# Altium footprint library MODULE_BBB.PcbLib: 1 footprints
Each footprint in its own frame and in the unit in brackets; x right, y up, seen from the top. Pads: shape width x height; smd on the part's side, far side on the other; paste and mask are expansions set on the pad; w line width, h text height; cw(c..) or ccw(c..) is an arc to the next point about the centre after c.
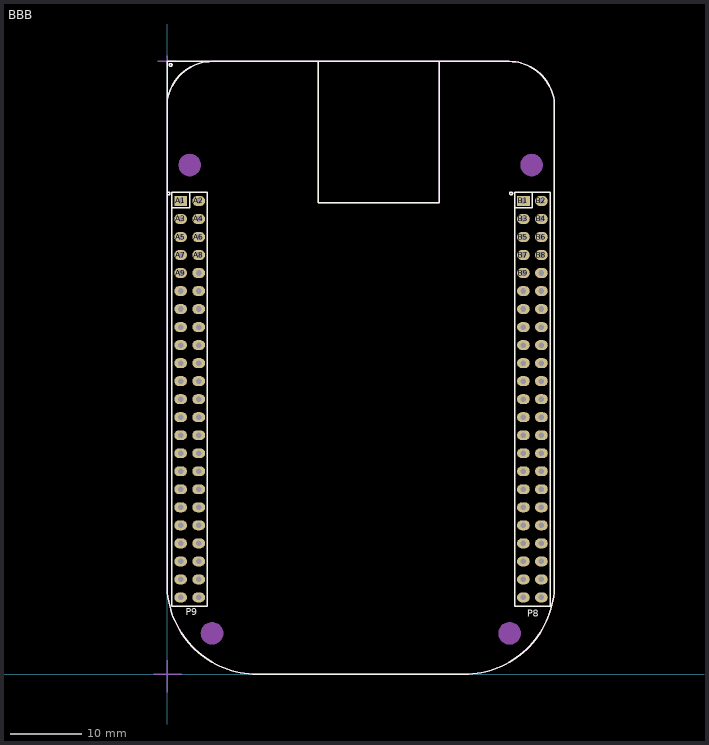
[diagram p0: the footprint, top view; thin cyan lines are the x and y axes]

## BBB [mm] "BeagleBoneBlack Board"
pads (188):
  round 1 on Mech1: 1(1.93,66.74) 1(50.23,66.74) 2(4.47,66.74) 2(52.77,66.74) 3(1.93,64.2) 3(50.23,64.2) 4(4.47,64.2) 4(52.77,64.2) 5(1.93,61.66) 5(50.23,61.66) 6(4.47,61.66) 6(52.77,61.66) 7(1.93,59.12) 7(50.23,59.12) 8(4.47,59.12) 8(52.77,59.12) 9(1.93,56.58) 9(50.23,56.58) 10(4.47,56.58) 10(52.77,56.58) 11(1.93,54.04) 11(50.23,54.04) 12(4.47,54.04) 12(52.77,54.04) 13(1.93,51.5) 13(50.23,51.5) 14(4.47,51.5) 14(52.77,51.5) 15(1.93,48.96) 15(50.23,48.96) 16(4.47,48.96) 16(52.77,48.96) 17(1.93,46.42) 17(50.23,46.42) 18(4.47,46.42) 18(52.77,46.42) 19(1.93,43.88) 19(50.23,43.88) 20(4.47,43.88) 20(52.77,43.88) 21(1.93,41.34) 21(50.23,41.34) 22(4.47,41.34) 22(52.77,41.34) 23(1.93,38.8) 23(50.23,38.8) 24(4.47,38.8) 24(52.77,38.8) 25(1.93,36.26) 25(50.23,36.26) 26(4.47,36.26) 26(52.77,36.26) 27(1.93,33.72) 27(50.23,33.72) 28(4.47,33.72) 28(52.77,33.72) 29(1.93,31.18) 29(50.23,31.18) 30(4.47,31.18) 30(52.77,31.18) 31(1.93,28.64) 31(50.23,28.64) 32(4.47,28.64) 32(52.77,28.64) 33(1.93,26.1) 33(50.23,26.1) 34(4.47,26.1) 34(52.77,26.1) 35(1.93,23.56) 35(50.23,23.56) 36(4.47,23.56) 36(52.77,23.56) 37(1.93,21.02) 37(50.23,21.02) 38(4.47,21.02) 38(52.77,21.02) 39(1.93,18.48) 39(50.23,18.48) 40(4.47,18.48) 40(52.77,18.48) 41(1.93,15.94) 41(50.23,15.94) 42(4.47,15.94) 42(52.77,15.94) 43(1.93,13.4) 43(50.23,13.4) 44(4.47,13.4) 44(52.77,13.4) 45(1.93,10.86) 45(50.23,10.86) 46(4.47,10.86) 46(52.77,10.86)
  rect 1.8x1.4 / inner rect 1.2x1.2 / far side rect 1.4x1.4 hole 0.8: A1(1.93,66.74) B1(50.23,66.74)
  oval 1.8x1.4 / inner round 1.2 / far side round 1.4 hole 0.8: A2(4.47,66.74) A3(1.93,64.2) A4(4.47,64.2) A5(1.93,61.66) A6(4.47,61.66) A7(1.93,59.12) A8(4.47,59.12) A9(1.93,56.58) A10(4.47,56.58) A11(1.93,54.04) A12(4.47,54.04) A13(1.93,51.5) A14(4.47,51.5) A15(1.93,48.96) A16(4.47,48.96) A17(1.93,46.42) A18(4.47,46.42) A19(1.93,43.88) A20(4.47,43.88) A21(1.93,41.34) A22(4.47,41.34) A23(1.93,38.8) A24(4.47,38.8) A25(1.93,36.26) A26(4.47,36.26) A27(1.93,33.72) A28(4.47,33.72) A29(1.93,31.18) A30(4.47,31.18) A31(1.93,28.64) A32(4.47,28.64) A33(1.93,26.1) A34(4.47,26.1) A35(1.93,23.56) A36(4.47,23.56) A37(1.93,21.02) A38(4.47,21.02) A39(1.93,18.48) A40(4.47,18.48) A41(1.93,15.94) A42(4.47,15.94) A43(1.93,13.4) A44(4.47,13.4) A45(1.93,10.86) A46(4.47,10.86) B2(52.77,66.74) B3(50.23,64.2) B4(52.77,64.2) B5(50.23,61.66) B6(52.77,61.66) B7(50.23,59.12) B8(52.77,59.12) B9(50.23,56.58) B10(52.77,56.58) B11(50.23,54.04) B12(52.77,54.04) B13(50.23,51.5) B14(52.77,51.5) B15(50.23,48.96) B16(52.77,48.96) B17(50.23,46.42) B18(52.77,46.42) B19(50.23,43.88) B20(52.77,43.88) B21(50.23,41.34) B22(52.77,41.34) B23(50.23,38.8) B24(52.77,38.8) B25(50.23,36.26) B26(52.77,36.26) B27(50.23,33.72) B28(52.77,33.72) B29(50.23,31.18) B30(52.77,31.18) B31(50.23,28.64) B32(52.77,28.64) B33(50.23,26.1) B34(52.77,26.1) B35(50.23,23.56) B36(52.77,23.56) B37(50.23,21.02) B38(52.77,21.02) B39(50.23,18.48) B40(52.77,18.48) B41(50.23,15.94) B42(52.77,15.94) B43(50.23,13.4) B44(52.77,13.4) B45(50.23,10.86) B46(52.77,10.86)
  round 3.2 on Mech1: ""(3.2,71.8) ""(6.35,5.8) ""(48.3,5.8) ""(51.4,71.8)
Top Overlay:
  circle w0.2: c0.505,85.915 r0.2
  circle w0.2: c0.2,67.8 r0.2
  circle w0.2: c48.5,67.8 r0.2
  lines w0.2: 0.7,65.8 3.2,65.8 3.2,68 ; 21.3,86.3 21.3,66.5 38.4,66.5 38.4,86.3 ; 49,65.8 51.5,65.8 51.5,68 ; 0,80.05 cw(c6.35,80.05) 6.35,86.4 ; 0,80.05 0,86.4 6.35,86.4 ; 0,80.05 0,12.74 ccw(c12.7,12.74) 12.7,0.04 41.91,0.04 ccw(c41.91,12.74) 54.61,12.74 54.61,80.05 ccw(c48.26,80.05) 48.26,86.4 6.35,86.4 ; 0.7,9.6 0.7,68 5.7,68 5.7,9.6 0.7,9.6 ; 49,9.6 49,68 54,68 54,9.6 49,9.6
  text "P9" at 2.605,8.315 h1
  text "P8" at 50.805,8.115 h1
Bottom Overlay:
  circle w0.2: c0.2,67.85 r0.2
  circle w0.2: c48.5,67.85 r0.2
  lines w0.2: 0.7,65.8 3.1,65.8 3.1,68 ; 49,65.8 51.4,65.8 51.4,68 ; 0.7,9.6 5.7,9.6 5.7,68 0.7,68 0.7,9.6 ; 49,9.6 54,9.6 54,68 49,68 49,9.6
  text "P9" at 4.005,8.315 h1
  text "P8" at 52.205,8.115 h1
Mechanical 1:
  lines w0.2: -1.9,0 2.1,0 ; -1.3,86.4 1.3,86.4 ; 0,-2.5 0,2 ; 0,85.6 0,87.2 ; 21.3,86.3 21.3,66.5 38.4,66.5 38.4,86.3 ; 0,12.74 ccw(c12.7,12.74) 12.7,0.04 41.91,0.04 ccw(c41.91,12.74) 54.61,12.74 54.61,80.05 ccw(c48.26,80.05) 48.26,86.4 6.35,86.4 ccw(c6.35,80.05) 0,80.05 0,12.74
3D body "PIN.STEP": height 8.43, standoff -2.49, extent 51.5,9.59 54.04,12.13
3D body "PIN.STEP": height 8.43, standoff -2.49, extent 48.96,9.59 51.5,12.13
3D body "PIN.STEP": height 8.43, standoff -2.49, extent 51.5,65.47 54.04,68.01
3D body "PIN_mid.STEP": height 8.43, standoff -2.49, extent 48.96,60.39 51.5,62.93
3D body "PIN_mid.STEP": height 8.43, standoff -2.49, extent 48.96,57.85 51.5,60.39
3D body "PIN_mid.STEP": height 8.43, standoff -2.49, extent 48.96,55.31 51.5,57.85
3D body "PIN_mid.STEP": height 8.43, standoff -2.49, extent 48.96,52.77 51.5,55.31
3D body "PIN_mid.STEP": height 8.43, standoff -2.49, extent 48.96,50.23 51.5,52.77
3D body "PIN_mid.STEP": height 8.43, standoff -2.49, extent 48.96,47.69 51.5,50.23
3D body "PIN_mid.STEP": height 8.43, standoff -2.49, extent 48.96,45.15 51.5,47.69
3D body "PIN_mid.STEP": height 8.43, standoff -2.49, extent 48.96,42.61 51.5,45.15
3D body "PIN_mid.STEP": height 8.43, standoff -2.49, extent 48.96,40.07 51.5,42.61
3D body "PIN_mid.STEP": height 8.43, standoff -2.49, extent 48.96,37.53 51.5,40.07
3D body "PIN_mid.STEP": height 8.43, standoff -2.49, extent 48.96,34.99 51.5,37.53
3D body "PIN_mid.STEP": height 8.43, standoff -2.49, extent 48.96,32.45 51.5,34.99
3D body "PIN_mid.STEP": height 8.43, standoff -2.49, extent 48.96,29.91 51.5,32.45
3D body "PIN_mid.STEP": height 8.43, standoff -2.49, extent 48.96,27.37 51.5,29.91
3D body "PIN_mid.STEP": height 8.43, standoff -2.49, extent 48.96,24.83 51.5,27.37
3D body "PIN_mid.STEP": height 8.43, standoff -2.49, extent 48.96,22.29 51.5,24.83
3D body "PIN_mid.STEP": height 8.43, standoff -2.49, extent 48.96,19.75 51.5,22.29
3D body "PIN_mid.STEP": height 8.43, standoff -2.49, extent 48.96,17.21 51.5,19.75
3D body "PIN_mid.STEP": height 8.43, standoff -2.49, extent 48.96,14.67 51.5,17.21
3D body "PIN_mid.STEP": height 8.43, standoff -2.49, extent 48.96,62.93 51.5,65.47
3D body "PIN_mid.STEP": height 8.43, standoff -2.49, extent 51.5,62.93 54.04,65.47
3D body "PIN_mid.STEP": height 8.43, standoff -2.49, extent 51.5,60.39 54.04,62.93
3D body "PIN_mid.STEP": height 8.43, standoff -2.49, extent 51.5,57.85 54.04,60.39
3D body "PIN_mid.STEP": height 8.43, standoff -2.49, extent 51.5,55.31 54.04,57.85
3D body "PIN_mid.STEP": height 8.43, standoff -2.49, extent 51.5,52.77 54.04,55.31
3D body "PIN_mid.STEP": height 8.43, standoff -2.49, extent 51.5,50.23 54.04,52.77
3D body "PIN_mid.STEP": height 8.43, standoff -2.49, extent 51.5,47.69 54.04,50.23
3D body "PIN_mid.STEP": height 8.43, standoff -2.49, extent 51.5,45.15 54.04,47.69
3D body "PIN_mid.STEP": height 8.43, standoff -2.49, extent 51.5,42.61 54.04,45.15
3D body "PIN_mid.STEP": height 8.43, standoff -2.49, extent 51.5,40.07 54.04,42.61
3D body "PIN_mid.STEP": height 8.43, standoff -2.49, extent 51.5,37.53 54.04,40.07
3D body "PIN_mid.STEP": height 8.43, standoff -2.49, extent 51.5,34.99 54.04,37.53
3D body "PIN_mid.STEP": height 8.43, standoff -2.49, extent 51.5,32.45 54.04,34.99
3D body "PIN_mid.STEP": height 8.43, standoff -2.49, extent 51.5,29.91 54.04,32.45
3D body "PIN_mid.STEP": height 8.43, standoff -2.49, extent 51.5,27.37 54.04,29.91
3D body "PIN_mid.STEP": height 8.43, standoff -2.49, extent 51.5,24.83 54.04,27.37
3D body "PIN_mid.STEP": height 8.43, standoff -2.49, extent 51.5,22.29 54.04,24.83
3D body "PIN_mid.STEP": height 8.43, standoff -2.49, extent 51.5,19.75 54.04,22.29
3D body "PIN_mid.STEP": height 8.43, standoff -2.49, extent 51.5,17.21 54.04,19.75
3D body "PIN_mid.STEP": height 8.43, standoff -2.49, extent 51.5,14.67 54.04,17.21
3D body "PIN.STEP": height 8.43, standoff -2.49, extent 48.96,65.47 51.5,68.01
3D body "PIN.STEP": height 8.43, standoff -2.49, extent 48.96,12.13 51.5,14.67
3D body "PIN.STEP": height 8.43, standoff -2.49, extent 51.5,12.13 54.04,14.67
3D body "PIN.STEP": height 8.43, standoff -2.49, extent 3.2,12.13 5.74,14.67
3D body "PIN.STEP": height 8.43, standoff -2.49, extent 0.66,12.13 3.2,14.67
3D body "PIN.STEP": height 8.43, standoff -2.49, extent 0.66,65.47 3.2,68.01
3D body "PIN_mid.STEP": height 8.43, standoff -2.49, extent 3.2,14.67 5.74,17.21
3D body "PIN_mid.STEP": height 8.43, standoff -2.49, extent 3.2,17.21 5.74,19.75
3D body "PIN_mid.STEP": height 8.43, standoff -2.49, extent 3.2,19.75 5.74,22.29
3D body "PIN_mid.STEP": height 8.43, standoff -2.49, extent 3.2,22.29 5.74,24.83
3D body "PIN_mid.STEP": height 8.43, standoff -2.49, extent 3.2,24.83 5.74,27.37
3D body "PIN_mid.STEP": height 8.43, standoff -2.49, extent 3.2,27.37 5.74,29.91
3D body "PIN_mid.STEP": height 8.43, standoff -2.49, extent 3.2,29.91 5.74,32.45
3D body "PIN_mid.STEP": height 8.43, standoff -2.49, extent 3.2,32.45 5.74,34.99
3D body "PIN_mid.STEP": height 8.43, standoff -2.49, extent 3.2,34.99 5.74,37.53
3D body "PIN_mid.STEP": height 8.43, standoff -2.49, extent 3.2,37.53 5.74,40.07
3D body "PIN_mid.STEP": height 8.43, standoff -2.49, extent 3.2,40.07 5.74,42.61
3D body "PIN_mid.STEP": height 8.43, standoff -2.49, extent 3.2,42.61 5.74,45.15
3D body "PIN_mid.STEP": height 8.43, standoff -2.49, extent 3.2,45.15 5.74,47.69
3D body "PIN_mid.STEP": height 8.43, standoff -2.49, extent 3.2,47.69 5.74,50.23
3D body "PIN_mid.STEP": height 8.43, standoff -2.49, extent 3.2,50.23 5.74,52.77
3D body "PIN_mid.STEP": height 8.43, standoff -2.49, extent 3.2,52.77 5.74,55.31
3D body "PIN_mid.STEP": height 8.43, standoff -2.49, extent 3.2,55.31 5.74,57.85
3D body "PIN_mid.STEP": height 8.43, standoff -2.49, extent 3.2,57.85 5.74,60.39
3D body "PIN_mid.STEP": height 8.43, standoff -2.49, extent 3.2,60.39 5.74,62.93
3D body "PIN_mid.STEP": height 8.43, standoff -2.49, extent 3.2,62.93 5.74,65.47
3D body "PIN_mid.STEP": height 8.43, standoff -2.49, extent 0.66,62.93 3.2,65.47
3D body "PIN_mid.STEP": height 8.43, standoff -2.49, extent 0.66,14.67 3.2,17.21
3D body "PIN_mid.STEP": height 8.43, standoff -2.49, extent 0.66,17.21 3.2,19.75
3D body "PIN_mid.STEP": height 8.43, standoff -2.49, extent 0.66,19.75 3.2,22.29
3D body "PIN_mid.STEP": height 8.43, standoff -2.49, extent 0.66,22.29 3.2,24.83
3D body "PIN_mid.STEP": height 8.43, standoff -2.49, extent 0.66,24.83 3.2,27.37
3D body "PIN_mid.STEP": height 8.43, standoff -2.49, extent 0.66,27.37 3.2,29.91
3D body "PIN_mid.STEP": height 8.43, standoff -2.49, extent 0.66,29.91 3.2,32.45
3D body "PIN_mid.STEP": height 8.43, standoff -2.49, extent 0.66,32.45 3.2,34.99
3D body "PIN_mid.STEP": height 8.43, standoff -2.49, extent 0.66,34.99 3.2,37.53
3D body "PIN_mid.STEP": height 8.43, standoff -2.49, extent 0.66,37.53 3.2,40.07
3D body "PIN_mid.STEP": height 8.43, standoff -2.49, extent 0.66,40.07 3.2,42.61
3D body "PIN_mid.STEP": height 8.43, standoff -2.49, extent 0.66,42.61 3.2,45.15
3D body "PIN_mid.STEP": height 8.43, standoff -2.49, extent 0.66,45.15 3.2,47.69
3D body "PIN_mid.STEP": height 8.43, standoff -2.49, extent 0.66,47.69 3.2,50.23
3D body "PIN_mid.STEP": height 8.43, standoff -2.49, extent 0.66,50.23 3.2,52.77
3D body "PIN_mid.STEP": height 8.43, standoff -2.49, extent 0.66,52.77 3.2,55.31
3D body "PIN_mid.STEP": height 8.43, standoff -2.49, extent 0.66,55.31 3.2,57.85
3D body "PIN_mid.STEP": height 8.43, standoff -2.49, extent 0.66,57.85 3.2,60.39
3D body "PIN_mid.STEP": height 8.43, standoff -2.49, extent 0.66,60.39 3.2,62.93
3D body "PIN.STEP": height 8.43, standoff -2.49, extent 3.2,65.47 5.74,68.01
3D body "PIN.STEP": height 8.43, standoff -2.49, extent 0.66,9.59 3.2,12.13
3D body "PIN.STEP": height 8.43, standoff -2.49, extent 3.2,9.59 5.74,12.13
3D body "BEAGLEBONE_BLACK.STEP": height 1.34, standoff -18.03, extent -0.06,-1.625 54.6,88.825